# Altium footprint library SMD_Bauteile.PcbLib: 355 footprints (part 13 of 23)
Each footprint in its own frame and in the unit in brackets; x right, y up, seen from the top. Pads: shape width x height; smd on the part's side, far side on the other; paste and mask are expansions set on the pad; w line width, h text height; cw(c..) or ccw(c..) is an arc to the next point about the centre after c.
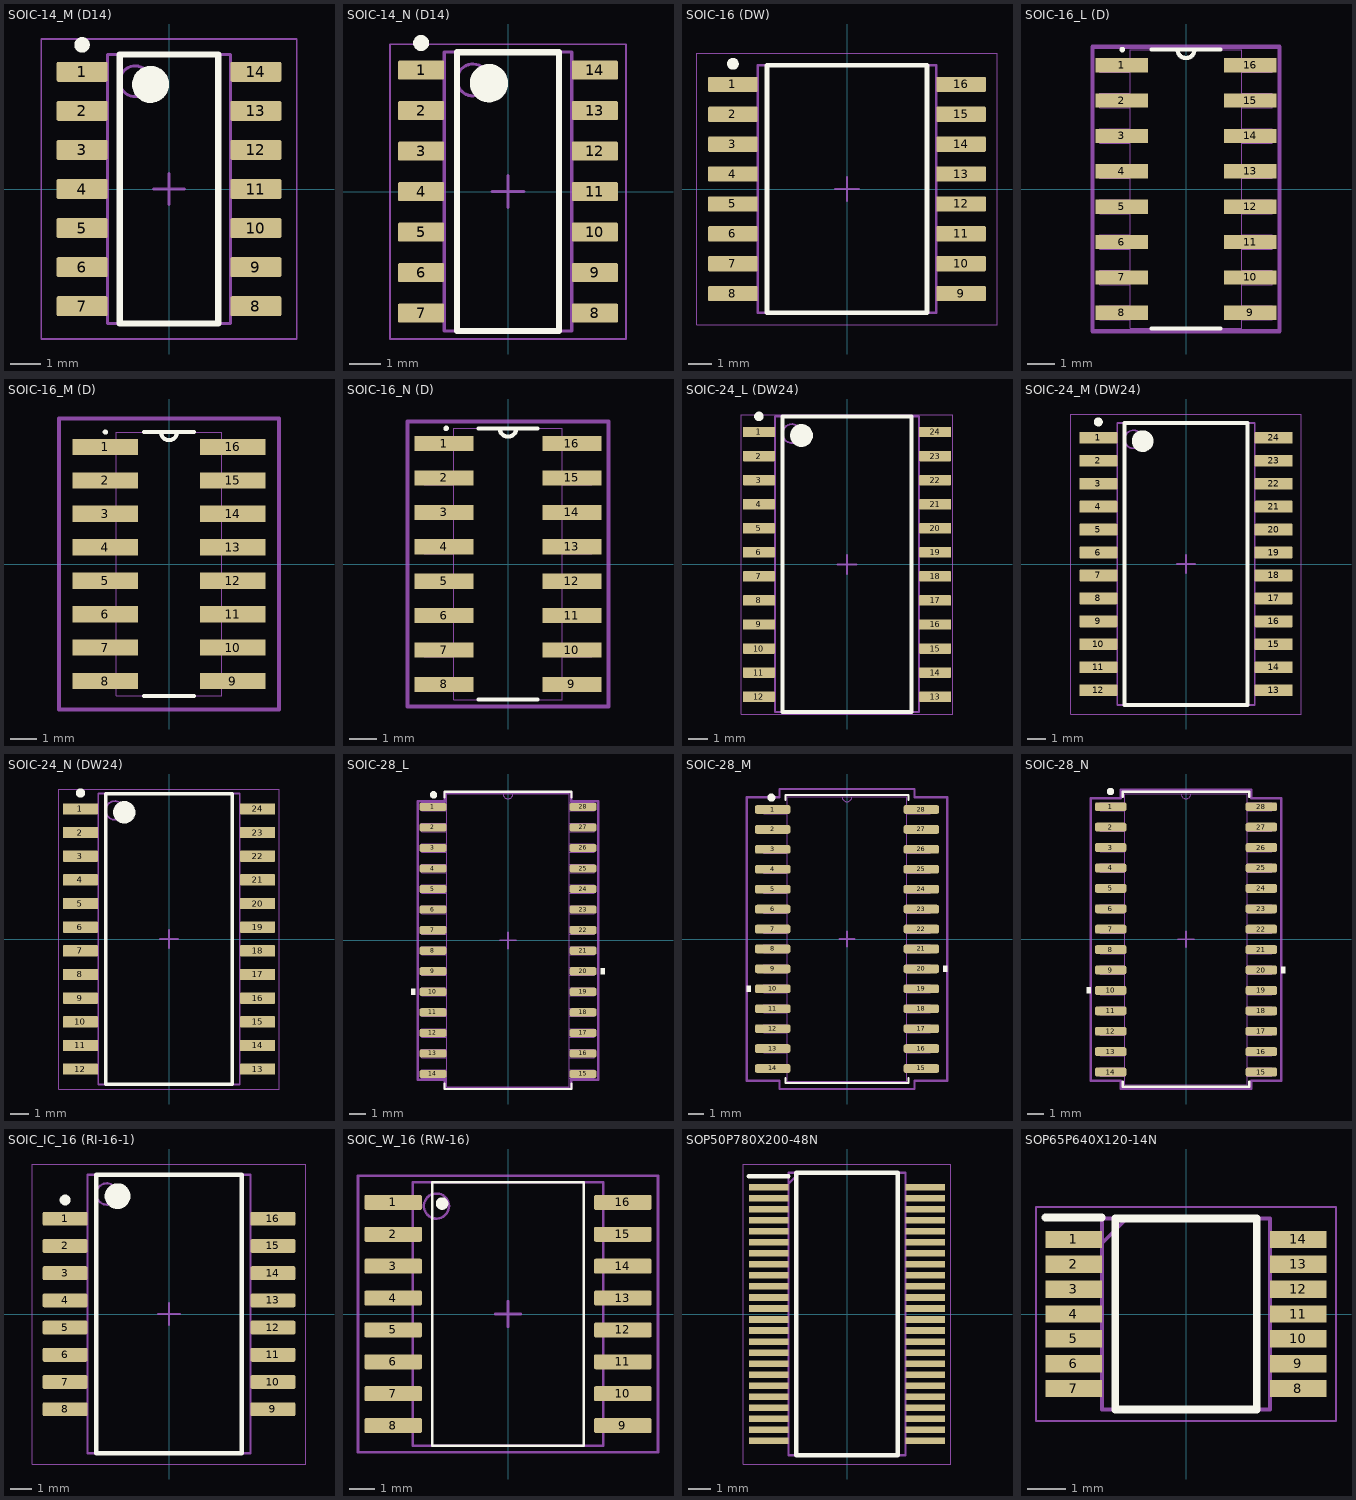
[diagram p12: the footprints below, top view; thin cyan lines are the x and y axes]

## SOIC-14_M (D14) [mm] "SOIC, 14-Leads, Body 8.75x4mm, Pitch 1.27mm, IPC Low Density"
height 1.75
pads (14):
  rrect15% 1.65x0.65 smd: 1(-2.825,3.81) 2(-2.825,2.54) 3(-2.825,1.27) 4(-2.825,0) 5(-2.825,-1.27) 6(-2.825,-2.54) 7(-2.825,-3.81) 8(2.825,-3.81) 9(2.825,-2.54) 10(2.825,-1.27) 11(2.825,0) 12(2.825,1.27) 13(2.825,2.54) 14(2.825,3.81)
Top Overlay:
  circle w0.6: c-0.6,3.4 r0.3
  circle w0.25: c-2.825,4.685 r0.125
  lines w0.2: -1.6,-4.375 1.6,-4.375 1.6,4.375 -1.6,4.375 -1.6,-4.375
Mech Misc 1:
  circle w0.1: c-1.1,3.5 r0.5
  lines w0.1: -2,-4.375 2,-4.375 2,4.375 -2,4.375 -2,-4.375
Mech 15:
  lines w0.05: -4.15,-4.875 4.15,-4.875 4.15,4.875 -4.15,4.875 -4.15,-4.875
  lines w0.1: -0.5,0 0.5,0 ; 0,-0.5 0,0.5
3D body "SOIC-14akaD0014AakaM14A.stp": height 1.59, standoff -0.01, extent -3.023,-4.318 3.022,4.318

## SOIC-14_N (D14) [mm] "SOIC, 14-Leads, Body 8.75x4mm, Pitch 1.27mm, IPC Medium Density"
height 1.75
pads (14):
  rrect17% 1.45x0.6 smd: 1(-2.725,3.81) 2(-2.725,2.54) 3(-2.725,1.27) 4(-2.725,0) 5(-2.725,-1.27) 6(-2.725,-2.54) 7(-2.725,-3.81) 8(2.725,-3.81) 9(2.725,-2.54) 10(2.725,-1.27) 11(2.725,0) 12(2.725,1.27) 13(2.725,2.54) 14(2.725,3.81)
Top Overlay:
  circle w0.25: c-2.725,4.66 r0.125
  circle w0.6: c-0.6,3.4 r0.3
  lines w0.2: -1.6,-4.375 -1.6,4.375 1.6,4.375 1.6,-4.375 -1.6,-4.375
Mech Misc 1:
  circle w0.1: c-1.1,3.5 r0.5
  lines w0.1: -2,-4.375 -2,4.375 2,4.375 2,-4.375 -2,-4.375
Mech 15:
  lines w0.05: -3.7,-4.625 -3.7,4.625 3.7,4.625 3.7,-4.625 -3.7,-4.625
  lines w0.1: -0.5,0 0.5,0 ; 0,-0.5 0,0.5
3D body "SOIC-14akaD0014AakaM14A.stp": height 1.59, standoff -0.01, extent -3.023,-4.318 3.022,4.318

## SOIC-16 (DW) [mm] "SOIC, 16-Leads, Body 10.5x7.6mm, Pitch 1.27mm, Texas Instruments, Package DW"
height 2.65
pads (16):
  rrect15% 2.1x0.65 smd: 1(-4.85,4.445) 2(-4.85,3.175) 3(-4.85,1.905) 4(-4.85,0.635) 5(-4.85,-0.635) 6(-4.85,-1.905) 7(-4.85,-3.175) 8(-4.85,-4.445) 9(4.85,-4.445) 10(4.85,-3.175) 11(4.85,-1.905) 12(4.85,-0.635) 13(4.85,0.635) 14(4.85,1.905) 15(4.85,3.175) 16(4.85,4.445)
Top Overlay:
  circle w0.25: c-4.85,5.32 r0.125
  lines w0.2: -3.4,-5.26 -3.4,5.26 3.4,5.26 3.4,-5.26 -3.4,-5.26
Top Component Center:
  lines w0.1: -0.5,0 0.5,0 ; 0,-0.5 0,0.5
Top Component Outline:
  lines w0.1: -3.8,-5.26 3.8,-5.26 3.8,5.26 -3.8,5.26 -3.8,-5.26
Top Courtyard (Mech26):
  lines w0.05: -6.375,-5.76 -6.375,5.76 6.375,5.76 6.375,-5.76 -6.375,-5.76
3D body "DW0016B.stp": height 2.59, standoff 0, extent -5.167,-5.15 5.167,5.15

## SOIC-16_L (D) [mil]
height 68.9
pads (16):
  rect 74x20 smd: 1(-91,175) 2(-91,125) 3(-91,75) 4(-91,25) 5(-91,-25) 6(-91,-75) 7(-91,-125) 8(-91,-175) 9(91,-175) 10(91,-125) 11(91,-75) 12(91,-25) 13(91,25) 14(91,75) 15(91,125) 16(91,175)
Top Overlay:
  circle w7.87: c-90,197.01 r0.01
  lines w6: -48.75,-197 48.75,-197 ; -48.75,197 48.75,197 ; -12,197 ccw(c0,197) 12,197
Mech Misc 1:
  lines w0: -12,197 ccw(c0,197) 12,197
  lines w1: -122,-185 -122,-165 -78.5,-165 -78.5,-185 -122,-185 ; -122,-135 -122,-115 -78.5,-115 -78.5,-135 -122,-135 ; -122,-85 -122,-65 -78.5,-65 -78.5,-85 -122,-85 ; -122,-35 -122,-15 -78.5,-15 -78.5,-35 -122,-35 ; -122,15 -122,35 -78.5,35 -78.5,15 -122,15 ; -122,65 -122,85 -78.5,85 -78.5,65 -122,65 ; -122,115 -122,135 -78.5,135 -78.5,115 -122,115 ; -122,165 -122,185 -78.5,185 -78.5,165 -122,165 ; -78.5,-197 78.5,-197 78.5,197 -78.5,197 -78.5,-197 ; 78.5,-185 78.5,-165 122,-165 122,-185 78.5,-185 ; 78.5,-135 78.5,-115 122,-115 122,-135 78.5,-135 ; 78.5,-85 78.5,-65 122,-65 122,-85 78.5,-85 ; 78.5,-35 78.5,-15 122,-15 122,-35 78.5,-35 ; 78.5,15 78.5,35 122,35 122,15 78.5,15 ; 78.5,65 78.5,85 122,85 122,65 78.5,65 ; 78.5,115 78.5,135 122,135 122,115 78.5,115 ; 78.5,165 78.5,185 122,185 122,165 78.5,165
Mech 15:
  lines w6: -132,-201 -132,201 132,201 132,-201 -132,-201
3D body: height 10, standoff 0, extent 0,0 10,10
3D body "SOIC-16 (D).stp": height 68.9, standoff 0, extent -118.62,-194.88 118.64,194.89

## SOIC-16_M (D) [mil]
height 68.9
pads (16):
  rect 98x24 smd: 1(-95,175) 2(-95,125) 3(-95,75) 4(-95,25) 5(-95,-25) 6(-95,-75) 7(-95,-125) 8(-95,-175) 9(95,-175) 10(95,-125) 11(95,-75) 12(95,-25) 13(95,25) 14(95,75) 15(95,125) 16(95,175)
Top Overlay:
  circle w7.87: c-95.01,197.01 r0.01
  lines w6: -37.54,-197 37.54,-197 ; -37.54,197 37.54,197 ; -12,197 ccw(c0,197) 12,197
Mech Misc 1:
  lines w0: -12,197 ccw(c0,197) 12,197
  lines w1: -122,-185 -78.5,-185 -78.5,-165 -122,-165 -122,-185 ; -122,-135 -78.5,-135 -78.5,-115 -122,-115 -122,-135 ; -122,-85 -78.5,-85 -78.5,-65 -122,-65 -122,-85 ; -122,-35 -78.5,-35 -78.5,-15 -122,-15 -122,-35 ; -122,15 -78.5,15 -78.5,35 -122,35 -122,15 ; -122,65 -78.5,65 -78.5,85 -122,85 -122,65 ; -122,115 -78.5,115 -78.5,135 -122,135 -122,115 ; -122,165 -78.5,165 -78.5,185 -122,185 -122,165 ; -78.5,-197 -78.5,197 78.5,197 78.5,-197 -78.5,-197 ; 78.5,-185 122,-185 122,-165 78.5,-165 78.5,-185 ; 78.5,-135 122,-135 122,-115 78.5,-115 78.5,-135 ; 78.5,-85 122,-85 122,-65 78.5,-65 78.5,-85 ; 78.5,-35 122,-35 122,-15 78.5,-15 78.5,-35 ; 78.5,15 122,15 122,35 78.5,35 78.5,15 ; 78.5,65 122,65 122,85 78.5,85 78.5,65 ; 78.5,115 122,115 122,135 78.5,135 78.5,115 ; 78.5,165 122,165 122,185 78.5,185 78.5,165
Mech 15:
  lines w6: -164,-217 164,-217 164,217 -164,217 -164,-217
3D body "SOIC-16 (D).stp": height 68.9, standoff 0, extent -118.62,-194.88 118.64,194.89
3D body: height 10, standoff 0, extent 0,0 10,10

## SOIC-16_N (D) [mil]
height 68.9
pads (16):
  rect 86x22 smd: 1(-93,175) 2(-93,125) 3(-93,75) 4(-93,25) 5(-93,-25) 6(-93,-75) 7(-93,-125) 8(-93,-175) 9(93,-175) 10(93,-125) 11(93,-75) 12(93,-25) 13(93,25) 14(93,75) 15(93,125) 16(93,175)
Top Overlay:
  circle w7.87: c-90.01,197.01 r0.01
  lines w6: -42.89,-197 42.89,-197 ; -42.89,197 42.89,197 ; -12,197 ccw(c0,197) 12,197
Mech Misc 1:
  lines w0: -12,197 ccw(c0,197) 12,197
  lines w1: -122,-185 -78.5,-185 -78.5,-165 -122,-165 -122,-185 ; -122,-135 -78.5,-135 -78.5,-115 -122,-115 -122,-135 ; -122,-85 -78.5,-85 -78.5,-65 -122,-65 -122,-85 ; -122,-35 -78.5,-35 -78.5,-15 -122,-15 -122,-35 ; -122,15 -78.5,15 -78.5,35 -122,35 -122,15 ; -122,65 -78.5,65 -78.5,85 -122,85 -122,65 ; -122,115 -78.5,115 -78.5,135 -122,135 -122,115 ; -122,165 -78.5,165 -78.5,185 -122,185 -122,165 ; -78.5,-197 -78.5,197 78.5,197 78.5,-197 -78.5,-197 ; 78.5,-185 122,-185 122,-165 78.5,-165 78.5,-185 ; 78.5,-135 122,-135 122,-115 78.5,-115 78.5,-135 ; 78.5,-85 122,-85 122,-65 78.5,-65 78.5,-85 ; 78.5,-35 122,-35 122,-15 78.5,-15 78.5,-35 ; 78.5,15 122,15 122,35 78.5,35 78.5,15 ; 78.5,65 122,65 122,85 78.5,85 78.5,65 ; 78.5,115 122,115 122,135 78.5,135 78.5,115 ; 78.5,165 122,165 122,185 78.5,185 78.5,165
Mech 15:
  lines w6: -146,-207 146,-207 146,207 -146,207 -146,-207
3D body "SOIC-16 (D).stp": height 68.9, standoff 0, extent -118.63,-194.88 118.64,194.89
3D body: height 10, standoff 0, extent 0,0 10,10

## SOIC-24_L (DW24) [mm] "SOIC, 24-Leads, Body 15.6x7.6mm, Pitch 1.27mm, IPC High Density"
height 2.65
pads (24):
  rrect18% 1.7x0.55 smd: 1(-4.65,6.985) 2(-4.65,5.715) 3(-4.65,4.445) 4(-4.65,3.175) 5(-4.65,1.905) 6(-4.65,0.635) 7(-4.65,-0.635) 8(-4.65,-1.905) 9(-4.65,-3.175) 10(-4.65,-4.445) 11(-4.65,-5.715) 12(-4.65,-6.985) 13(4.65,-6.985) 14(4.65,-5.715) 15(4.65,-4.445) 16(4.65,-3.175) 17(4.65,-1.905) 18(4.65,-0.635) 19(4.65,0.635) 20(4.65,1.905) 21(4.65,3.175) 22(4.65,4.445) 23(4.65,5.715) 24(4.65,6.985)
Top Overlay:
  circle w0.25: c-4.65,7.81 r0.125
  circle w0.6: c-2.4,6.8 r0.3
  lines w0.2: -3.4,-7.8 -3.4,7.8 3.4,7.8 3.4,-7.8 -3.4,-7.8
Mech Misc 1:
  circle w0.1: c-2.9,6.9 r0.5
  lines w0.1: -3.8,-7.8 -3.8,7.8 3.8,7.8 3.8,-7.8 -3.8,-7.8
Mech 15:
  lines w0.05: -5.575,-7.9 -5.575,7.9 5.575,7.9 5.575,-7.9 -5.575,-7.9
  lines w0.1: -0.5,0 0.5,0 ; 0,-0.5 0,0.5
3D body: height 2.65, standoff 0.1, extent -3.8,-7.8 3.8,7.8

## SOIC-24_M (DW24) [mm] "SOIC, 24-Leads, Body 15.6x7.6mm, Pitch 1.27mm, IPC Low Density"
height 2.65
pads (24):
  rrect15% 2.1x0.65 smd: 1(-4.85,6.985) 2(-4.85,5.715) 3(-4.85,4.445) 4(-4.85,3.175) 5(-4.85,1.905) 6(-4.85,0.635) 7(-4.85,-0.635) 8(-4.85,-1.905) 9(-4.85,-3.175) 10(-4.85,-4.445) 11(-4.85,-5.715) 12(-4.85,-6.985) 13(4.85,-6.985) 14(4.85,-5.715) 15(4.85,-4.445) 16(4.85,-3.175) 17(4.85,-1.905) 18(4.85,-0.635) 19(4.85,0.635) 20(4.85,1.905) 21(4.85,3.175) 22(4.85,4.445) 23(4.85,5.715) 24(4.85,6.985)
Top Overlay:
  circle w0.6: c-2.4,6.8 r0.3
  circle w0.25: c-4.85,7.86 r0.125
  lines w0.2: -3.4,-7.8 3.4,-7.8 3.4,7.8 -3.4,7.8 -3.4,-7.8
Mech Misc 1:
  circle w0.1: c-2.9,6.9 r0.5
  lines w0.1: -3.8,-7.8 3.8,-7.8 3.8,7.8 -3.8,7.8 -3.8,-7.8
Mech 15:
  lines w0.05: -6.375,-8.3 6.375,-8.3 6.375,8.3 -6.375,8.3 -6.375,-8.3
  lines w0.1: -0.5,0 0.5,0 ; 0,-0.5 0,0.5
3D body: height 2.65, standoff 0.1, extent -3.8,-7.8 3.8,7.8

## SOIC-24_N (DW24) [mm] "SOIC, 24-Leads, Body 15.6x7.6mm, Pitch 1.27mm, IPC Medium Density"
height 2.65
pads (24):
  rrect17% 1.9x0.6 smd: 1(-4.75,6.985) 2(-4.75,5.715) 3(-4.75,4.445) 4(-4.75,3.175) 5(-4.75,1.905) 6(-4.75,0.635) 7(-4.75,-0.635) 8(-4.75,-1.905) 9(-4.75,-3.175) 10(-4.75,-4.445) 11(-4.75,-5.715) 12(-4.75,-6.985) 13(4.75,-6.985) 14(4.75,-5.715) 15(4.75,-4.445) 16(4.75,-3.175) 17(4.75,-1.905) 18(4.75,-0.635) 19(4.75,0.635) 20(4.75,1.905) 21(4.75,3.175) 22(4.75,4.445) 23(4.75,5.715) 24(4.75,6.985)
Top Overlay:
  circle w0.25: c-4.75,7.835 r0.125
  circle w0.6: c-2.4,6.8 r0.3
  lines w0.2: -3.4,-7.8 -3.4,7.8 3.4,7.8 3.4,-7.8 -3.4,-7.8
Mech Misc 1:
  circle w0.1: c-2.9,6.9 r0.5
  lines w0.1: -3.8,-7.8 -3.8,7.8 3.8,7.8 3.8,-7.8 -3.8,-7.8
Mech 15:
  lines w0.05: -5.925,-8.05 -5.925,8.05 5.925,8.05 5.925,-8.05 -5.925,-8.05
  lines w0.1: -0.5,0 0.5,0 ; 0,-0.5 0,0.5
3D body: height 2.65, standoff 0.1, extent -3.8,-7.8 3.8,7.8

## SOIC-28_L [mm]
height 2.65
pads (28):
  rrect50% 1.67x0.508 smd: 1(-4.636,8.255) 2(-4.636,6.985) 3(-4.636,5.715) 4(-4.636,4.445) 5(-4.636,3.175) 6(-4.636,1.905) 7(-4.636,0.635) 8(-4.636,-0.635) 9(-4.636,-1.905) 10(-4.636,-3.175) 11(-4.636,-4.445) 12(-4.636,-5.715) 13(-4.636,-6.985) 14(-4.636,-8.255) 15(4.636,-8.255) 16(4.636,-6.985) 17(4.636,-5.715) 18(4.636,-4.445) 19(4.636,-3.175) 20(4.636,-1.905) 21(4.636,-0.635) 22(4.636,0.635) 23(4.636,1.905) 24(4.636,3.175) 25(4.636,4.445) 26(4.636,5.715) 27(4.636,6.985) 28(4.636,8.255)
Top Overlay:
  circle w0.254: c-4.6,9 r0.1
  region: 5.725,-1.714 5.979,-1.714 5.979,-2.095 5.725,-2.095
  region: -5.725,-2.984 -5.979,-2.984 -5.979,-3.365 -5.725,-3.365
  lines w0.152: -3.924,-8.842 -3.924,-9.182 3.924,-9.182 3.924,-8.842 ; -3.924,8.842 -3.924,9.182 3.924,9.182 3.924,8.842
Bottom Designator:
  lines w0.152: -5.573,-8.611 -3.899,-8.611 -3.899,-9.157 3.899,-9.157 3.899,-8.611 5.573,-8.611 5.573,8.611 3.899,8.611 3.899,9.157 -3.899,9.157 -3.899,8.611 -5.573,8.611 -5.573,-8.611
Bottom 3D Body:
  lines w0.1: -0.5,0 0.5,0 ; 0,-0.5 0,0.5
Top Courtyard (Mech14):
  lines w0: -0.305,9.055 ccw(c0,9.055) 0.305,9.055
  lines w0.025: -5.321,-8.509 -5.321,-8.001 -3.797,-8.001 -3.797,-8.509 -5.321,-8.509 ; -5.321,-7.239 -3.797,-7.239 -3.797,-6.731 -5.321,-6.731 -5.321,-7.239 ; -5.321,-5.969 -5.321,-5.461 -3.797,-5.461 -3.797,-5.969 -5.321,-5.969 ; -5.321,-4.699 -5.321,-4.191 -3.797,-4.191 -3.797,-4.699 -5.321,-4.699 ; -5.321,-3.429 -5.321,-2.921 -3.797,-2.921 -3.797,-3.429 -5.321,-3.429 ; -5.321,-2.159 -5.321,-1.651 -3.797,-1.651 -3.797,-2.159 -5.321,-2.159 ; -5.321,-0.889 -5.321,-0.381 -3.797,-0.381 -3.797,-0.889 -5.321,-0.889 ; -5.321,0.381 -5.321,0.889 -3.797,0.889 -3.797,0.381 -5.321,0.381 ; -5.321,1.651 -5.321,2.159 -3.797,2.159 -3.797,1.651 -5.321,1.651 ; -5.321,2.921 -5.321,3.429 -3.797,3.429 -3.797,2.921 -5.321,2.921 ; -5.321,4.191 -5.321,4.699 -3.797,4.699 -3.797,4.191 -5.321,4.191 ; -5.321,5.461 -5.321,5.969 -3.797,5.969 -3.797,5.461 -5.321,5.461 ; -5.321,6.731 -5.321,7.239 -3.797,7.239 -3.797,6.731 -5.321,6.731 ; -5.321,8.001 -5.321,8.509 -3.797,8.509 -3.797,8.001 -5.321,8.001 ; -3.797,-9.055 3.797,-9.055 3.797,9.055 -3.797,9.055 -3.797,-9.055 ; 3.797,-8.509 3.797,-8.001 5.321,-8.001 5.321,-8.509 3.797,-8.509 ; 3.797,-7.239 3.797,-6.731 5.321,-6.731 5.321,-7.239 3.797,-7.239 ; 3.797,-5.969 3.797,-5.461 5.321,-5.461 5.321,-5.969 3.797,-5.969 ; 3.797,-4.699 5.321,-4.699 5.321,-4.191 3.797,-4.191 3.797,-4.699 ; 3.797,-3.429 3.797,-2.921 5.321,-2.921 5.321,-3.429 3.797,-3.429 ; 3.797,-2.159 3.797,-1.651 5.321,-1.651 5.321,-2.159 3.797,-2.159 ; 3.797,-0.889 5.321,-0.889 5.321,-0.381 3.797,-0.381 3.797,-0.889 ; 3.797,0.381 3.797,0.889 5.321,0.889 5.321,0.381 3.797,0.381 ; 3.797,1.651 3.797,2.159 5.321,2.159 5.321,1.651 3.797,1.651 ; 3.797,2.921 3.797,3.429 5.321,3.429 5.321,2.921 3.797,2.921 ; 3.797,4.191 3.797,4.699 5.321,4.699 5.321,4.191 3.797,4.191 ; 3.797,5.461 3.797,5.969 5.321,5.969 5.321,5.461 3.797,5.461 ; 3.797,6.731 3.797,7.239 5.321,7.239 5.321,6.731 3.797,6.731 ; 3.797,8.001 3.797,8.509 5.321,8.509 5.321,8.001 3.797,8.001
3D body "RW_28_ADI.step": height 2.64, standoff 0, extent -5.321,-9.055 5.321,9.055

## SOIC-28_M [mm]
height 2.65
pads (28):
  rrect50% 2.27x0.558 smd: 1(-4.736,8.255) 2(-4.736,6.985) 3(-4.736,5.715) 4(-4.736,4.445) 5(-4.736,3.175) 6(-4.736,1.905) 7(-4.736,0.635) 8(-4.736,-0.635) 9(-4.736,-1.905) 10(-4.736,-3.175) 11(-4.736,-4.445) 12(-4.736,-5.715) 13(-4.736,-6.985) 14(-4.736,-8.255) 15(4.736,-8.255) 16(4.736,-6.985) 17(4.736,-5.715) 18(4.736,-4.445) 19(4.736,-3.175) 20(4.736,-1.905) 21(4.736,-0.635) 22(4.736,0.635) 23(4.736,1.905) 24(4.736,3.175) 25(4.736,4.445) 26(4.736,5.715) 27(4.736,6.985) 28(4.736,8.255)
Top Overlay:
  circle w0.254: c-4.826,9.017 r0.127
  region: -6.125,-2.984 -6.379,-2.984 -6.379,-3.365 -6.125,-3.365
  region: 6.125,-1.714 6.379,-1.714 6.379,-2.095 6.125,-2.095
  lines w0.152: -3.924,-8.867 -3.924,-9.182 3.924,-9.182 3.924,-8.867 ; -3.924,8.867 -3.924,9.182 3.924,9.182 3.924,8.867
Bottom Designator:
  lines w0.152: -6.379,-9.042 -6.379,9.042 -4.305,9.042 -4.305,9.563 4.305,9.563 4.305,9.042 6.379,9.042 6.379,-9.042 4.305,-9.042 4.305,-9.563 -4.305,-9.563 -4.305,-9.042 -6.379,-9.042
Bottom 3D Body:
  lines w0.1: -0.5,0 0.5,0 ; 0,-0.5 0,0.5
Top Courtyard (Mech14):
  lines w0: -0.305,9.055 ccw(c0,9.055) 0.305,9.055
  lines w0.025: -5.321,-8.509 -3.797,-8.509 -3.797,-8.001 -5.321,-8.001 -5.321,-8.509 ; -5.321,-7.239 -3.797,-7.239 -3.797,-6.731 -5.321,-6.731 -5.321,-7.239 ; -5.321,-5.969 -3.797,-5.969 -3.797,-5.461 -5.321,-5.461 -5.321,-5.969 ; -5.321,-4.699 -3.797,-4.699 -3.797,-4.191 -5.321,-4.191 -5.321,-4.699 ; -5.321,-3.429 -3.797,-3.429 -3.797,-2.921 -5.321,-2.921 -5.321,-3.429 ; -5.321,-2.159 -3.797,-2.159 -3.797,-1.651 -5.321,-1.651 -5.321,-2.159 ; -5.321,-0.889 -3.797,-0.889 -3.797,-0.381 -5.321,-0.381 -5.321,-0.889 ; -5.321,0.381 -3.797,0.381 -3.797,0.889 -5.321,0.889 -5.321,0.381 ; -5.321,1.651 -3.797,1.651 -3.797,2.159 -5.321,2.159 -5.321,1.651 ; -5.321,2.921 -3.797,2.921 -3.797,3.429 -5.321,3.429 -5.321,2.921 ; -5.321,4.191 -3.797,4.191 -3.797,4.699 -5.321,4.699 -5.321,4.191 ; -5.321,5.461 -5.321,5.969 -3.797,5.969 -3.797,5.461 -5.321,5.461 ; -5.321,6.731 -3.797,6.731 -3.797,7.239 -5.321,7.239 -5.321,6.731 ; -5.321,8.001 -3.797,8.001 -3.797,8.509 -5.321,8.509 -5.321,8.001 ; -3.797,-9.055 3.797,-9.055 3.797,9.055 -3.797,9.055 -3.797,-9.055 ; 3.797,-8.509 5.321,-8.509 5.321,-8.001 3.797,-8.001 3.797,-8.509 ; 3.797,-7.239 5.321,-7.239 5.321,-6.731 3.797,-6.731 3.797,-7.239 ; 3.797,-5.969 5.321,-5.969 5.321,-5.461 3.797,-5.461 3.797,-5.969 ; 3.797,-4.699 5.321,-4.699 5.321,-4.191 3.797,-4.191 3.797,-4.699 ; 3.797,-3.429 3.797,-2.921 5.321,-2.921 5.321,-3.429 3.797,-3.429 ; 3.797,-2.159 5.321,-2.159 5.321,-1.651 3.797,-1.651 3.797,-2.159 ; 3.797,-0.889 5.321,-0.889 5.321,-0.381 3.797,-0.381 3.797,-0.889 ; 3.797,0.381 3.797,0.889 5.321,0.889 5.321,0.381 3.797,0.381 ; 3.797,1.651 5.321,1.651 5.321,2.159 3.797,2.159 3.797,1.651 ; 3.797,2.921 5.321,2.921 5.321,3.429 3.797,3.429 3.797,2.921 ; 3.797,4.191 3.797,4.699 5.321,4.699 5.321,4.191 3.797,4.191 ; 3.797,5.461 5.321,5.461 5.321,5.969 3.797,5.969 3.797,5.461 ; 3.797,6.731 5.321,6.731 5.321,7.239 3.797,7.239 3.797,6.731 ; 3.797,8.001 5.321,8.001 5.321,8.509 3.797,8.509 3.797,8.001
3D body "RW_28_ADI.step": height 2.64, standoff 0, extent -5.321,-9.055 5.321,9.055

## SOIC-28_N [mm]
height 2.65
pads (28):
  rrect50% 1.97x0.558 smd: 1(-4.686,8.255) 2(-4.686,6.985) 3(-4.686,5.715) 4(-4.686,4.445) 5(-4.686,3.175) 6(-4.686,1.905) 7(-4.686,0.635) 8(-4.686,-0.635) 9(-4.686,-1.905) 10(-4.686,-3.175) 11(-4.686,-4.445) 12(-4.686,-5.715) 13(-4.686,-6.985) 14(-4.686,-8.255) 15(4.686,-8.255) 16(4.686,-6.985) 17(4.686,-5.715) 18(4.686,-4.445) 19(4.686,-3.175) 20(4.686,-1.905) 21(4.686,-0.635) 22(4.686,0.635) 23(4.686,1.905) 24(4.686,3.175) 25(4.686,4.445) 26(4.686,5.715) 27(4.686,6.985) 28(4.686,8.255)
Top Overlay:
  circle w0.254: c-4.7,9.2 r0.1
  region: 5.925,-1.714 6.179,-1.714 6.179,-2.095 5.925,-2.095
  region: -5.925,-2.984 -6.179,-2.984 -6.179,-3.365 -5.925,-3.365
  lines w0.152: -3.924,-8.867 -3.924,-9.182 3.924,-9.182 3.924,-8.867 ; -3.924,8.867 -3.924,9.182 3.924,9.182 3.924,8.867
Bottom Designator:
  lines w0.152: -5.925,-8.788 -4.051,-8.788 -4.051,-9.309 4.051,-9.309 4.051,-8.788 5.925,-8.788 5.925,8.788 4.051,8.788 4.051,9.309 -4.051,9.309 -4.051,8.788 -5.925,8.788 -5.925,-8.788
Bottom 3D Body:
  lines w0.1: -0.5,0 0.5,0 ; 0,-0.5 0,0.5
Top Courtyard (Mech14):
  lines w0: -0.305,9.055 ccw(c0,9.055) 0.305,9.055
  lines w0.025: -5.321,-8.509 -5.321,-8.001 -3.797,-8.001 -3.797,-8.509 -5.321,-8.509 ; -5.321,-7.239 -5.321,-6.731 -3.797,-6.731 -3.797,-7.239 -5.321,-7.239 ; -5.321,-5.969 -5.321,-5.461 -3.797,-5.461 -3.797,-5.969 -5.321,-5.969 ; -5.321,-4.699 -5.321,-4.191 -3.797,-4.191 -3.797,-4.699 -5.321,-4.699 ; -5.321,-3.429 -5.321,-2.921 -3.797,-2.921 -3.797,-3.429 -5.321,-3.429 ; -5.321,-2.159 -5.321,-1.651 -3.797,-1.651 -3.797,-2.159 -5.321,-2.159 ; -5.321,-0.889 -3.797,-0.889 -3.797,-0.381 -5.321,-0.381 -5.321,-0.889 ; -5.321,0.381 -5.321,0.889 -3.797,0.889 -3.797,0.381 -5.321,0.381 ; -5.321,1.651 -5.321,2.159 -3.797,2.159 -3.797,1.651 -5.321,1.651 ; -5.321,2.921 -3.797,2.921 -3.797,3.429 -5.321,3.429 -5.321,2.921 ; -5.321,4.191 -5.321,4.699 -3.797,4.699 -3.797,4.191 -5.321,4.191 ; -5.321,5.461 -5.321,5.969 -3.797,5.969 -3.797,5.461 -5.321,5.461 ; -5.321,6.731 -3.797,6.731 -3.797,7.239 -5.321,7.239 -5.321,6.731 ; -5.321,8.001 -5.321,8.509 -3.797,8.509 -3.797,8.001 -5.321,8.001 ; -3.797,-9.055 -3.797,9.055 3.797,9.055 3.797,-9.055 -3.797,-9.055 ; 3.797,-8.509 3.797,-8.001 5.321,-8.001 5.321,-8.509 3.797,-8.509 ; 3.797,-7.239 3.797,-6.731 5.321,-6.731 5.321,-7.239 3.797,-7.239 ; 3.797,-5.969 3.797,-5.461 5.321,-5.461 5.321,-5.969 3.797,-5.969 ; 3.797,-4.699 5.321,-4.699 5.321,-4.191 3.797,-4.191 3.797,-4.699 ; 3.797,-3.429 3.797,-2.921 5.321,-2.921 5.321,-3.429 3.797,-3.429 ; 3.797,-2.159 3.797,-1.651 5.321,-1.651 5.321,-2.159 3.797,-2.159 ; 3.797,-0.889 5.321,-0.889 5.321,-0.381 3.797,-0.381 3.797,-0.889 ; 3.797,0.381 3.797,0.889 5.321,0.889 5.321,0.381 3.797,0.381 ; 3.797,1.651 3.797,2.159 5.321,2.159 5.321,1.651 3.797,1.651 ; 3.797,2.921 3.797,3.429 5.321,3.429 5.321,2.921 3.797,2.921 ; 3.797,4.191 3.797,4.699 5.321,4.699 5.321,4.191 3.797,4.191 ; 3.797,5.461 3.797,5.969 5.321,5.969 5.321,5.461 3.797,5.461 ; 3.797,6.731 3.797,7.239 5.321,7.239 5.321,6.731 3.797,6.731 ; 3.797,8.001 3.797,8.509 5.321,8.509 5.321,8.001 3.797,8.001
3D body "RW_28_ADI.step": height 2.64, standoff 0, extent -5.321,-9.055 5.321,9.055

## SOIC_IC_16 (RI-16-1) [mm] "SOIC, 16-Leads, Body 12,80x7,50mm, Pitch 1,27mm, IPC Low Density"
height 2.65
pads (16):
  rrect25% 2.1x0.65 smd: 1(-4.85,4.445) 2(-4.85,3.175) 3(-4.85,1.905) 4(-4.85,0.635) 5(-4.85,-0.635) 6(-4.85,-1.905) 7(-4.85,-3.175) 8(-4.85,-4.445) 9(4.85,-4.445) 10(4.85,-3.175) 11(4.85,-1.905) 12(4.85,-0.635) 13(4.85,0.635) 14(4.85,1.905) 15(4.85,3.175) 16(4.85,4.445)
Top Overlay:
  circle w0.6: c-2.4,5.5 r0.3
  circle w0.25: c-4.85,5.32 r0.125
  lines w0.2: -3.4,-6.5 3.4,-6.5 3.4,6.5 -3.4,6.5 -3.4,-6.5
Mech Misc 1:
  circle w0.1: c-2.9,5.6 r0.5
  lines w0.1: -3.8,-6.5 3.8,-6.5 3.8,6.5 -3.8,6.5 -3.8,-6.5
Mech 15:
  lines w0.05: -6.375,-7 6.375,-7 6.375,7 -6.375,7 -6.375,-7
  lines w0.1: -0.5,0 0.5,0 ; 0,-0.5 0,0.5
3D body "SOIC127P1030X265-16M.step": height 2.65, standoff 0, extent -5.162,-6.5 5.162,6.5

## SOIC_W_16 (RW-16) [mm] "SOIC, 16-Leads, Body 10,5x7,6mm (max), Pitch 1,27mm, IPC Medium Density"
height 2.65
pads (16):
  rrect25% 2.3x0.6 smd: 1(-4.575,4.445) 2(-4.575,3.175) 3(-4.575,1.905) 4(-4.575,0.635) 5(-4.575,-0.635) 6(-4.575,-1.905) 7(-4.575,-3.175) 8(-4.575,-4.445) 9(4.575,-4.445) 10(4.575,-3.175) 11(4.575,-1.905) 12(4.575,-0.635) 13(4.575,0.635) 14(4.575,1.905) 15(4.575,3.175) 16(4.575,4.445)
Top Overlay:
  circle w0.25: c-2.625,4.4 r0.125
  lines w0.1: -3.025,-5.25 -3.025,5.25 3.025,5.25 3.025,-5.25 -3.025,-5.25
Mech Misc 1:
  circle w0.1: c-2.85,4.3 r0.5
  lines w0.1: -3.8,-5.25 -3.8,5.25 3.8,5.25 3.8,-5.25 -3.8,-5.25
Mech 15:
  lines w0.1: -0.5,0 0.5,0 ; 0,-0.5 0,0.5 ; -5.975,-5.5 -5.975,5.5 5.975,5.5 5.975,-5.5 -5.975,-5.5
3D body "ADUM6400.stp": height 2.3, standoff 0, extent -5.15,-5.15 5.15,5.15

## SOP50P780X200-48N [mm]
pads (48):
  rect 1.8x0.3 smd: 1(-3.55,5.75) 2(-3.55,5.25) 3(-3.55,4.75) 4(-3.55,4.25) 5(-3.55,3.75) 6(-3.55,3.25) 7(-3.55,2.75) 8(-3.55,2.25) 9(-3.55,1.75) 10(-3.55,1.25) 11(-3.55,0.75) 12(-3.55,0.25) 13(-3.55,-0.25) 14(-3.55,-0.75) 15(-3.55,-1.25) 16(-3.55,-1.75) 17(-3.55,-2.25) 18(-3.55,-2.75) 19(-3.55,-3.25) 20(-3.55,-3.75) 21(-3.55,-4.25) 22(-3.55,-4.75) 23(-3.55,-5.25) 24(-3.55,-5.75) 25(3.55,-5.75) 26(3.55,-5.25) 27(3.55,-4.75) 28(3.55,-4.25) 29(3.55,-3.75) 30(3.55,-3.25) 31(3.55,-2.75) 32(3.55,-2.25) 33(3.55,-1.75) 34(3.55,-1.25) 35(3.55,-0.75) 36(3.55,-0.25) 37(3.55,0.25) 38(3.55,0.75) 39(3.55,1.25) 40(3.55,1.75) 41(3.55,2.25) 42(3.55,2.75) 43(3.55,3.25) 44(3.55,3.75) 45(3.55,4.25) 46(3.55,4.75) 47(3.55,5.25) 48(3.55,5.75)
Top Overlay:
  lines w0.2: -4.45,6.25 -2.65,6.25 ; -2.3,-6.4 -2.3,6.4 2.3,6.4 2.3,-6.4 -2.3,-6.4
Mech 15:
  lines w0.1: -2.65,5.9 -2.15,6.4 ; -2.65,-6.4 -2.65,6.4 2.65,6.4 2.65,-6.4 -2.65,-6.4
Top 3D Body:
  lines w0.05: -4.7,-6.8 -4.7,6.8 4.7,6.8 4.7,-6.8 -4.7,-6.8

## SOP65P640X120-14N [mm]
pads (14):
  rect 1.475x0.45 smd: 1(-2.938,1.95) 2(-2.938,1.3) 3(-2.938,0.65) 4(-2.938,0) 5(-2.938,-0.65) 6(-2.938,-1.3) 7(-2.938,-1.95) 8(2.938,-1.95) 9(2.938,-1.3) 10(2.938,-0.65) 11(2.938,0) 12(2.938,0.65) 13(2.938,1.3) 14(2.938,1.95)
Top Overlay:
  lines w0.2: -3.675,2.525 -2.2,2.525 ; -1.85,-2.5 1.85,-2.5 1.85,2.5 -1.85,2.5 -1.85,-2.5
Mech Misc 1:
  lines w0.1: -2.2,1.85 -1.55,2.5 ; -2.2,-2.5 2.2,-2.5 2.2,2.5 -2.2,2.5 -2.2,-2.5
Mech 15:
  lines w0.05: -3.925,-2.8 3.925,-2.8 3.925,2.8 -3.925,2.8 -3.925,-2.8
3D body "ADG3304BRUZ.stp": height 1.2, standoff 0, extent -3.2,-2.5 3.2,2.5